# Altium footprint library ZJUDancer_Circuit_V4.1.PcbLib: 96 footprints (part 3 of 6)
Each footprint in its own frame and in the unit in brackets; x right, y up, seen from the top. Pads: shape width x height; smd on the part's side, far side on the other; paste and mask are expansions set on the pad; w line width, h text height; cw(c..) or ccw(c..) is an arc to the next point about the centre after c.
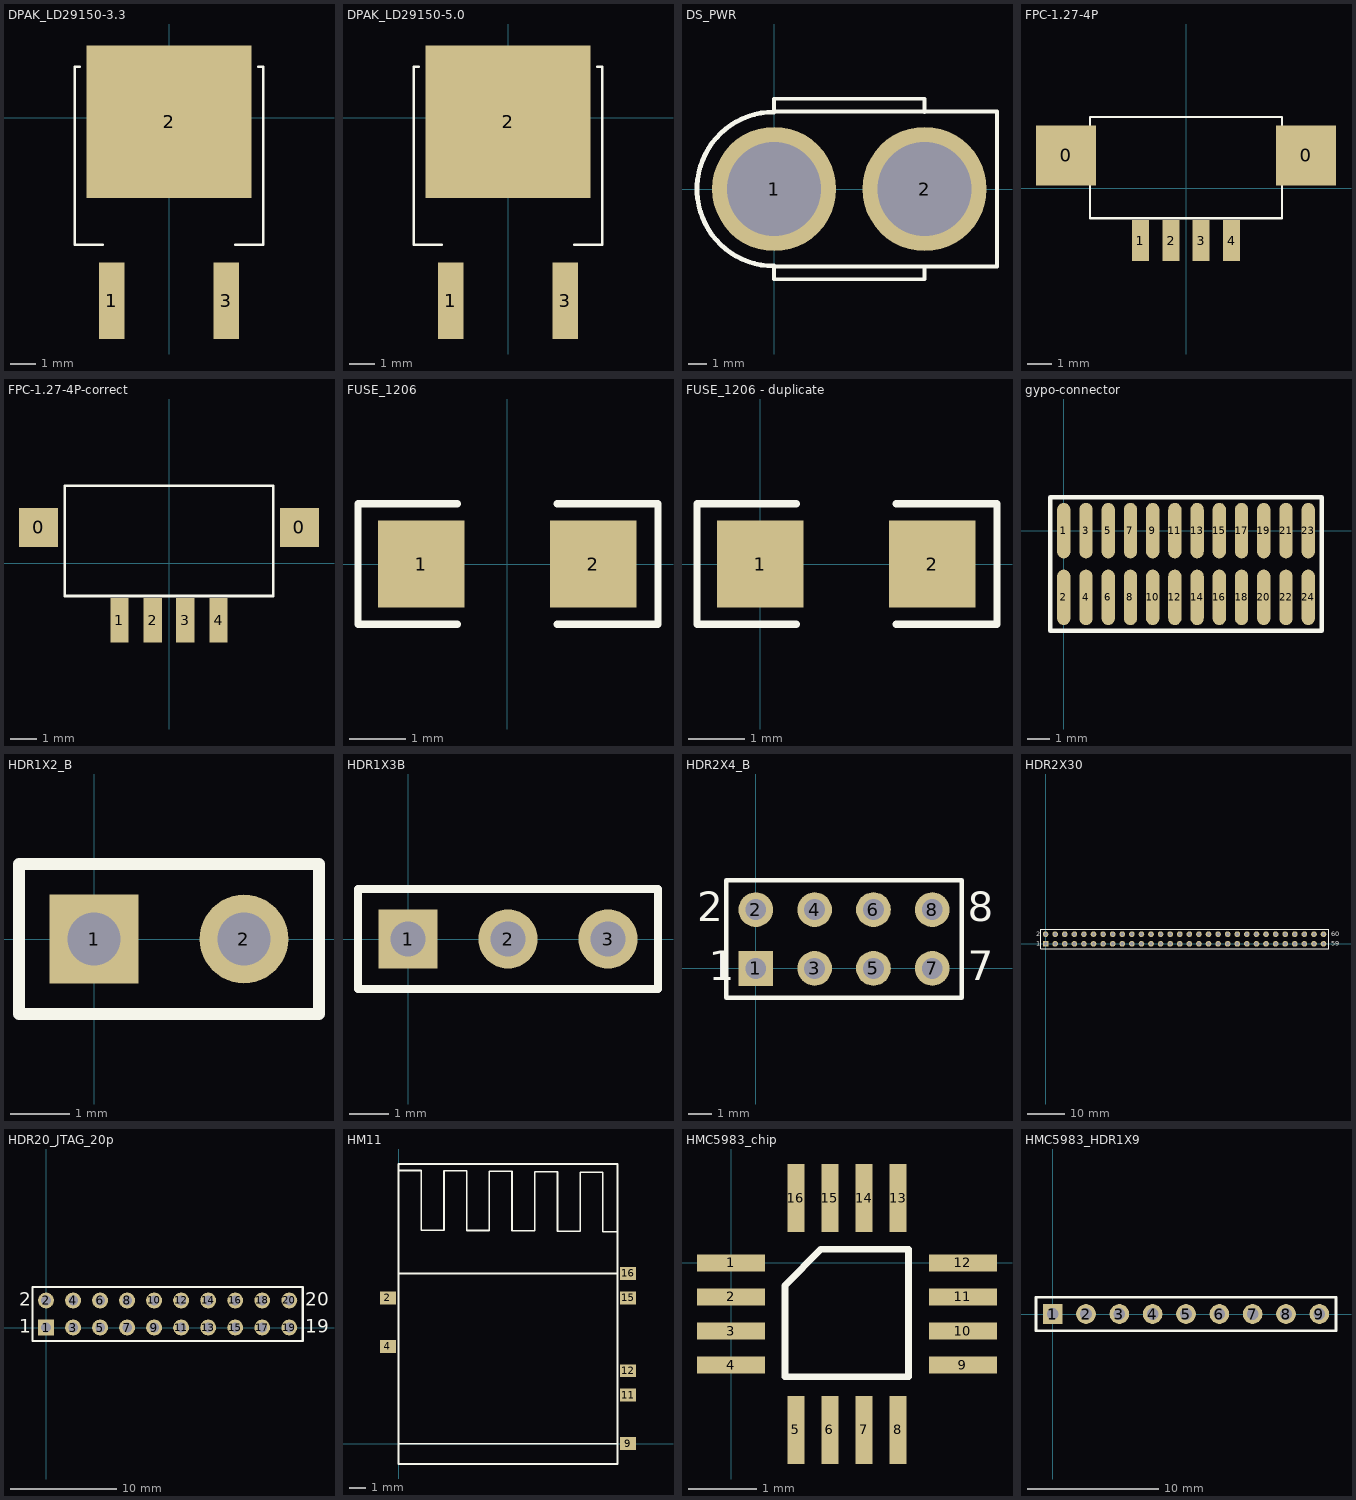
[diagram p2: the footprints below, top view; thin cyan lines are the x and y axes]

## DPAK_LD29150-3.3 [mm]
pads (3):
  rect 1x3 smd: 1(-2.25,-7.196) 3(2.25,-7.196)
  rect 6.5x6 smd: 2(0,-0.163)
Top Overlay:
  lines w0.1: -3.5,2 -3.7,2 -3.7,-5 -2.6,-5 ; 2.6,-5 3.7,-5 3.7,2 3.5,2
3D body: height 2.32, standoff 0.02, extent -3.25,-8 3.25,2

## DPAK_LD29150-5.0 [mm]
pads (3):
  rect 1x3 smd: 1(-2.25,-7.196) 3(2.25,-7.196)
  rect 6.5x6 smd: 2(0,-0.163)
Top Overlay:
  lines w0.1: -3.5,2 -3.7,2 -3.7,-5 -2.6,-5 ; 2.6,-5 3.7,-5 3.7,2 3.5,2
3D body: height 2.32, standoff 0.02, extent -3.25,-7.95 3.25,2.05

## DS_PWR [mm]
pads (2):
  round 6.6 hole 5: 1(0,0) 2(8,0)
Top Overlay:
  lines w0.2: -0.025,4.125 11.85,4.125 11.85,-4.125 0,-4.125 ; 0,-4.15 0,-4.8 8,-4.8 8,-4.175 ; 0,4.1 0,4.8 8,4.8 8,4.1
  lines w0.254: 0,-4.1 cw(c0,0) 0,4.1
3D body: height 15.5, standoff -5.5, extent -3.95,-3.775 11.55,3.725

## FPC-1.27-4P [mm]
pads (6):
  rect 2.5x2.5 smd: 0(-5,1.375) 0(5,1.375)
  rect 0.7x1.7 smd: 1(-1.9,-2.175) 2(-0.625,-2.175) 3(0.625,-2.175) 4(1.9,-2.175)
Top Overlay:
  lines w0.1: -4,-1.25 4,-1.25 4,2.975 -4,2.975 -4,-1.25
3D body: height 3.72, standoff 0.02, extent -4.875,-2.025 4.875,2.975

## FPC-1.27-4P-correct [mm]
pads (6):
  rect 1.5x1.5 smd: 0(-5,1.375) 0(5,1.375)
  rect 0.7x1.7 smd: 1(-1.9,-2.175) 2(-0.625,-2.175) 3(0.625,-2.175) 4(1.9,-2.175)
Top Overlay:
  lines w0.1: -4,-1.25 4,-1.25 4,2.975 -4,2.975 -4,-1.25
3D body: height 3.72, standoff 0.02, extent -4.875,-2.025 4.875,2.975

## FUSE_1206 [mil] "自恢复保险丝1206封装"
pads (2):
  rect 60x60 smd: 1(-59.63,0) 2(59.63,0)
Top Overlay:
  lines w5: -34.63,-41.73 -103.33,-41.73 -103.33,41.73 -34.63,41.73 ; 34.63,-41.73 104.55,-41.73 104.55,41.73 34.63,41.73
3D body: height 24.22, standoff 0.6, extent -63.38,-31.49 63.39,31.51

## FUSE_1206 - duplicate [mil] "保险丝1206封装"
pads (2):
  rect 60x60 smd: 1(0,0) 2(119.25,0)
Top Overlay:
  lines w5: 25,-41.73 -43.7,-41.73 -43.7,41.73 25,41.73 ; 94.25,-41.73 164.17,-41.73 164.17,41.73 94.25,41.73
3D body: height 24.22, standoff 0.6, extent -4.33,-31.5 122.45,31.5

## gypo-connector [mm]
pads (24):
  oval 0.6x2.5 smd: 1(0,0) 2(0,-3) 3(1,0) 4(1,-3) 5(2,0) 6(2,-3) 7(3,0) 8(3,-3) 9(4,0) 10(4,-3) 11(5,0) 12(5,-3) 13(6,0) 14(6,-3) 15(7,0) 16(7,-3) 17(8,0) 18(8,-3) 19(9,0) 20(9,-3) 21(10,0) 22(10,-3) 23(11,0) 24(11,-3)
Top Overlay:
  lines w0.2: -0.6,-4.5 -0.6,1.5 11.6,1.5 11.6,-4.5 -0.6,-4.5

## HDR1X2_B [mm] "Connector; Header; 2 Position"
pads (2):
  rect 1.5x1.5 hole 0.9: 1(0,0)
  round 1.5 hole 0.9: 2(2.54,0)
Top Overlay:
  lines w0.2: -1.27,-1.27 -1.27,1.27 3.81,1.27 3.81,-1.27 -1.27,-1.27
3D body: height 7.12, standoff -2.58, extent -1.27,-1.26 3.81,1.28

## HDR1X3B [mm] "Connector; Header; 3 Position"
pads (3):
  rect 1.5x1.5 hole 0.9: 1(0,0)
  round 1.5 hole 0.9: 2(2.54,0) 3(5.08,0)
Top Overlay:
  lines w0.2: -1.27,-1.27 6.35,-1.27 6.35,1.27 -1.27,1.27 -1.27,-1.27
3D body: height 7.12, standoff -2.58, extent -1.26,-1.29 6.36,1.25

## HDR2X4_B [mm] "Connector; Header; 4x2 Position"
pads (8):
  rect 1.5x1.5 hole 0.9: 1(0,0)
  round 1.5 hole 0.9: 2(0,2.54) 3(2.54,0) 4(2.54,2.54) 5(5.08,0) 6(5.08,2.54) 7(7.62,0) 8(7.62,2.54)
Top Overlay:
  lines w0.2: -1.27,-1.27 8.89,-1.27 8.89,3.81 -1.27,3.81 -1.27,-1.27
  text "2" at -2.54,2.032 h1.27
  text "1" at -2.032,-0.508 h1.27
  text "7" at 9.144,-0.508 h1.27
  text "8" at 9.144,2.032 h1.27
3D body: height 7.12, standoff -2.58, extent -1.28,-1.3 8.88,3.78

## HDR2X30 [mm] "Connector; Header; 30x2 Position"
pads (60):
  rect 1.5x1.5 hole 0.9: 1(0,0)
  round 1.5 hole 0.9: 2(0,2.54) 3(2.54,0) 4(2.54,2.54) 5(5.08,0) 6(5.08,2.54) 7(7.62,0) 8(7.62,2.54) 9(10.16,0) 10(10.16,2.54) 11(12.7,0) 12(12.7,2.54) 13(15.24,0) 14(15.24,2.54) 15(17.78,0) 16(17.78,2.54) 17(20.32,0) 18(20.32,2.54) 19(22.86,0) 20(22.86,2.54) 21(25.4,0) 22(25.4,2.54) 23(27.94,0) 24(27.94,2.54) 25(30.48,0) 26(30.48,2.54) 27(33.02,0) 28(33.02,2.54) 29(35.56,0) 30(35.56,2.54) 31(38.1,0) 32(38.1,2.54) 33(40.64,0) 34(40.64,2.54) 35(43.18,0) 36(43.18,2.54) 37(45.72,0) 38(45.72,2.54) 39(48.26,0) 40(48.26,2.54) 41(50.8,0) 42(50.8,2.54) 43(53.34,0) 44(53.34,2.54) 45(55.88,0) 46(55.88,2.54) 47(58.42,0) 48(58.42,2.54) 49(60.96,0) 50(60.96,2.54) 51(63.5,0) 52(63.5,2.54) 53(66.04,0) 54(66.04,2.54) 55(68.58,0) 56(68.58,2.54) 57(71.12,0) 58(71.12,2.54) 59(73.66,0) 60(73.66,2.54)
Top Overlay:
  lines w0.2: -1.27,-1.27 75.06,-1.27 75.06,3.81 -1.27,3.81 -1.27,-1.27
  text "60" at 75.692,2.032 h1.27
  text "59" at 75.692,-0.508 h1.27
  text "1" at -2.54,-0.508 h1.27
  text "2" at -2.54,2.032 h1.27

## HDR20_JTAG_20p [mm] "Connector; Header; 10x2 Position"
pads (20):
  rect 1.5x1.5 hole 0.9: 1(0,0)
  round 1.5 hole 0.9: 2(0,2.54) 3(2.54,0) 4(2.54,2.54) 5(5.08,0) 6(5.08,2.54) 7(7.62,0) 8(7.62,2.54) 9(10.16,0) 10(10.16,2.54) 11(12.7,0) 12(12.7,2.54) 13(15.24,0) 14(15.24,2.54) 15(17.78,0) 16(17.78,2.54) 17(20.32,0) 18(20.32,2.54) 19(22.86,0) 20(22.86,2.54)
Top Overlay:
  lines w0.2: -1.27,-1.27 -1.27,3.81 0.635,3.81 24.13,3.81 24.13,-1.27 0.635,-1.27 -1.27,-1.27
  text "2" at -2.54,2.032 h1.27
  text "1" at -2.54,-0.508 h1.27
  text "19" at 24.384,-0.508 h1.27
  text "20" at 24.384,2.032 h1.27

## HM11 [mm]
pads (7):
  rect 1x0.8 smd: 2(-0.65,9) 4(-0.65,6) 9(14.15,0) 11(14.15,3) 12(14.15,4.5) 15(14.15,9) 16(14.15,10.5)
Top Overlay:
  lines w0.1: 0,10.5 13.5,10.5 ; 0,16.85 1.4,16.85 1.4,13.175 2.8,13.175 2.8,16.825 4.2,16.825 4.2,13.15 5.6,13.15 5.6,16.8 7,16.8 7,13.125 8.4,13.125 8.4,16.775 9.8,16.775 9.8,13.1 11.2,13.1 11.2,16.75 12.6,16.75 12.6,13.075 13.5,13.075 ; 13.5,0 0,0 ; 0,0 0,17.25 13.5,17.25 13.5,-1.25 0,-1.25 0,0
3D body: height 1.63, standoff 0.02, extent 0,-1.25 13.5,17.25

## HMC5983_chip [mm]
pads (16):
  rect 1x0.25 smd: 1(0,0) 2(0,-0.5) 3(0,-1) 4(0,-1.5) 9(3.4,-1.5) 10(3.4,-1) 11(3.4,-0.5) 12(3.4,0)
  rect 0.25x1 smd: 5(0.95,-2.45) 6(1.45,-2.45) 7(1.95,-2.45) 8(2.45,-2.45) 13(2.45,0.95) 14(1.95,0.95) 15(1.45,0.95) 16(0.95,0.95)
Top Overlay:
  lines w0.1: 0.79,-1.67 2.6,-1.67 2.6,0.2 1.32,0.2 0.79,-0.33 0.79,-1.67
3D body: height 0.94, standoff 0.02, extent 0.185,-2.265 3.205,0.755

## HMC5983_HDR1X9 [mm] "Connector; Header; 9 Position"
pads (9):
  rect 1.5x1.5 hole 0.9: 1(0,0)
  round 1.5 hole 0.9: 2(2.54,0) 3(5.08,0) 4(7.62,0) 5(10.16,0) 6(12.7,0) 7(15.24,0) 8(17.78,0) 9(20.32,0)
Top Overlay:
  lines w0.2: -1.27,-1.27 -1.27,1.27 21.59,1.27 21.59,-1.27 -1.27,-1.27
3D body: height 12.66, standoff -2.58, extent -1.3,-14 21.7,1.5